# Altium schematic symbol library Regulator_Linear.SchLib: 1538 symbols (part 4 of 9)
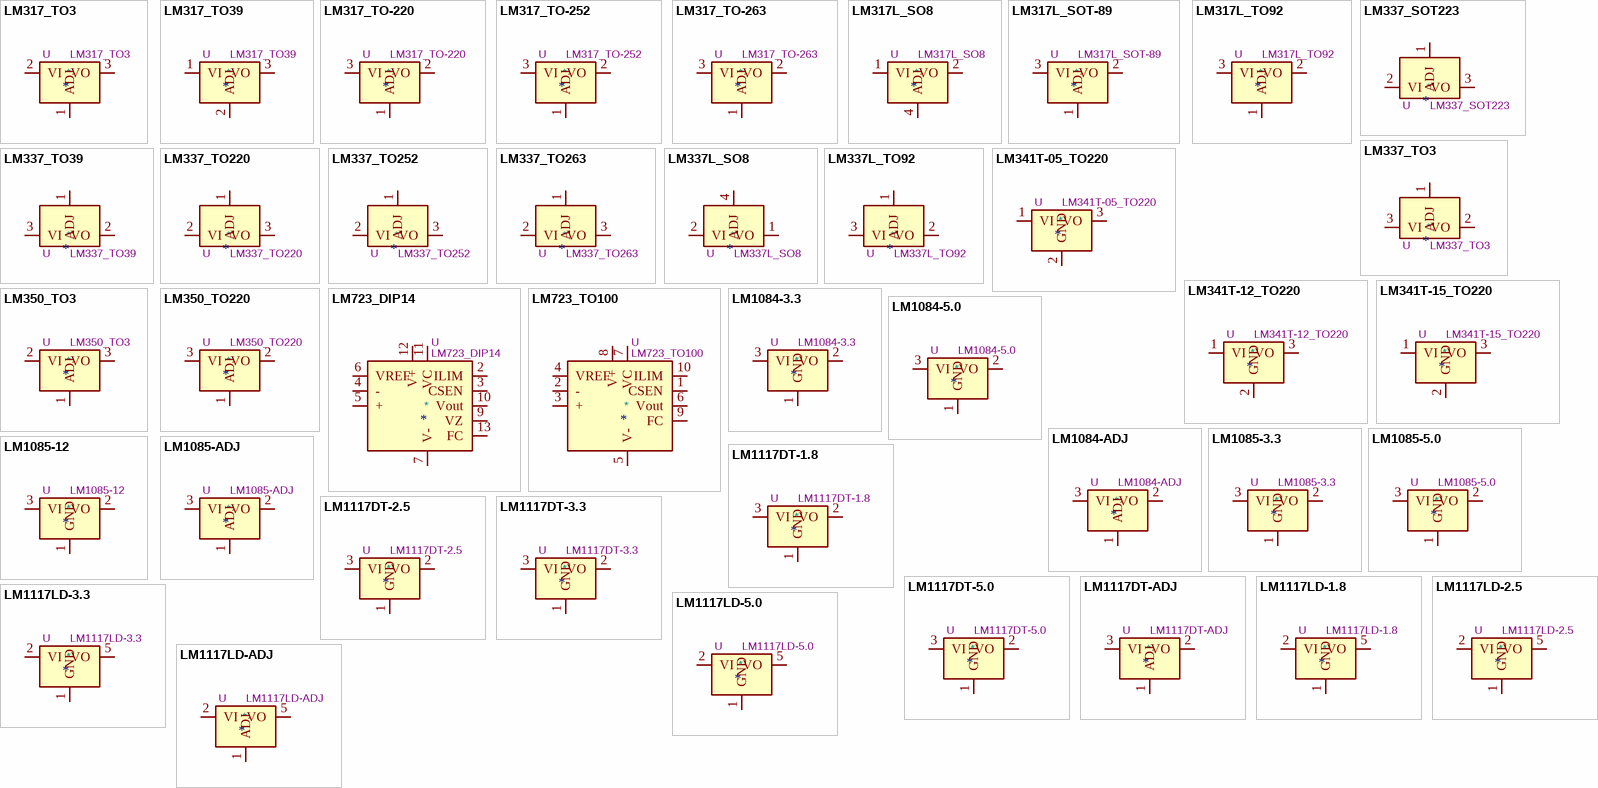
[diagram p41: symbols LM317_TO3 to LM1117LD-ADJ]

## LM350_TO3
designator *  value LM350_TO3  Reference: U
ki_keywords: Adjustable Voltage Regulator 3A Positive; ki_description: 3A 33V Adjustable Linear Regulator, TO-3; ki_fp_filters: TO?3*; Footprint: Package_TO_SOT_THT:TO-3; Datasheet: http://www.ti.com/lit/ds/symlink/lm350a.pdf
pins: 1 ADJ, 2 VI, 3 VO

## LM350_TO220
designator *  value LM350_TO220  Reference: U
ki_keywords: Adjustable Voltage Regulator 3A Positive; ki_description: 3A 33V Adjustable Linear Regulator, TO-220; ki_fp_filters: TO?220*; Footprint: Package_TO_SOT_THT:TO-220-3_Vertical; Datasheet: https://www.onsemi.com/pub/Collateral/LM350-D.pdf
pins: 1 ADJ, 2 VO, 3 VI

## LM723_DIP14
designator *  value LM723_DIP14  Reference: U
ki_keywords: POWER REGUL; ki_description: Linear Regulator (adjustable), DIP-14; ki_fp_filters: DIP*W7.62mm*; Footprint: Package_DIP:DIP-14_W7.62mm; Datasheet: http://www.ti.com/lit/ds/symlink/lm723.pdf
pins: 1 NC hidden, 2 ILIM, 3 CSEN, 4 -, 5 +, 6 VREF, 7 V-, 8 NC hidden, 9 VZ, 10 Vout, 11 VC, 12 V+, 13 FC, 14 NC hidden

## LM723_TO100
designator *  value LM723_TO100  Reference: U
ki_keywords: POWER REGUL; ki_description: Linear Regulator (adjustable), TO-100; ki_fp_filters: TO?100*; Footprint: Package_TO_SOT_THT:TO-100-10; Datasheet: http://www.ti.com/lit/ds/symlink/lm723.pdf
pins: 1 CSEN, 2 -, 3 +, 4 VREF, 5 V-, 6 Vout, 7 VC, 8 V+, 9 FC, 10 ILIM

## LM1084-3.3
designator *  value LM1084-3.3  Reference: U
ki_keywords: Voltage Regulator Fixed 5A Positive; ki_description: 5A 27V Linear Regulator, Fixed Output 3.3V, TO-220/TO-263; ki_fp_filters: TO?220* TO?263*; Datasheet: http://www.ti.com/lit/ds/symlink/lm1084.pdf
pins: 1 GND, 2 VO, 3 VI

## LM1084-5.0
designator *  value LM1084-5.0  Reference: U
ki_keywords: Voltage Regulator 5A Positive; ki_description: 5A 27V Linear Regulator, Fixed Output 5.0V, TO-220/TO-263; ki_fp_filters: TO?220* TO?263*; Datasheet: http://www.ti.com/lit/ds/symlink/lm1084.pdf
pins: 1 GND, 2 VO, 3 VI

## LM1084-ADJ
designator *  value LM1084-ADJ  Reference: U
ki_keywords: Adjustable Voltage Regulator 5A Positive; ki_description: 5A 29V Adjustable Linear Regulator, TO-220 / TO-263 (D2-PAK); ki_fp_filters: TO?220* TO?263*; Datasheet: http://www.ti.com/lit/ds/symlink/lm1084.pdf
pins: 1 ADJ, 2 VO, 3 VI

## LM1085-3.3
designator *  value LM1085-3.3  Reference: U
ki_keywords: Voltage Regulator Fixed 5A Positive; ki_description: 3A 27V Linear Regulator, Fixed Output 3.3V, TO-220/TO-263; ki_fp_filters: TO?220* TO?263*; Datasheet: http://www.ti.com/lit/ds/symlink/lm1085.pdf
pins: 1 GND, 2 VO, 3 VI

## LM1085-5.0
designator *  value LM1085-5.0  Reference: U
ki_keywords: Voltage Regulator 5A Positive; ki_description: 3A 25V Linear Regulator, Fixed Output 5.0V, TO-220/TO-263; ki_fp_filters: TO?220* TO?263*; Datasheet: http://www.ti.com/lit/ds/symlink/lm1085.pdf
pins: 1 GND, 2 VO, 3 VI

## LM1085-12
designator *  value LM1085-12  Reference: U
ki_keywords: Voltage Regulator 5A Positive; ki_description: 3A 18V Linear Regulator, Fixed Output 12.0V, TO-220/TO-263; ki_fp_filters: TO?220* TO?263*; Datasheet: http://www.ti.com/lit/ds/symlink/lm1085.pdf
pins: 1 GND, 2 VO, 3 VI

## LM1085-ADJ
designator *  value LM1085-ADJ  Reference: U
ki_keywords: Adjustable Voltage Regulator 5A Positive; ki_description: 3A 29V Adjustable Linear Regulator, TO-220 / TO-263 (D2-PAK); ki_fp_filters: TO?220* TO?263*; Datasheet: http://www.ti.com/lit/ds/symlink/lm1085.pdf
pins: 1 ADJ, 2 VO, 3 VI

## LM1117DT-1.8
designator *  value LM1117DT-1.8  Reference: U
ki_keywords: linear regulator ldo fixed positive; ki_description: 800mA Low-Dropout Linear Regulator, 1.8V fixed output, TO-252; ki_fp_filters: TO?252*; Footprint: Package_TO_SOT_SMD:TO-252-3_TabPin2; Datasheet: http://www.ti.com/lit/ds/symlink/lm1117.pdf
pins: 1 GND, 2 VO, 3 VI

## LM1117DT-2.5
designator *  value LM1117DT-2.5  Reference: U
ki_keywords: linear regulator ldo fixed positive; ki_description: 800mA Low-Dropout Linear Regulator, 2.5V fixed output, TO-252; ki_fp_filters: TO?252*; Footprint: Package_TO_SOT_SMD:TO-252-3_TabPin2; Datasheet: http://www.ti.com/lit/ds/symlink/lm1117.pdf
pins: 1 GND, 2 VO, 3 VI

## LM1117DT-3.3
designator *  value LM1117DT-3.3  Reference: U
ki_keywords: linear regulator ldo fixed positive; ki_description: 800mA Low-Dropout Linear Regulator, 3.3V fixed output, TO-252; ki_fp_filters: TO?252*; Footprint: Package_TO_SOT_SMD:TO-252-3_TabPin2; Datasheet: http://www.ti.com/lit/ds/symlink/lm1117.pdf
pins: 1 GND, 2 VO, 3 VI

## LM1117DT-5.0
designator *  value LM1117DT-5.0  Reference: U
ki_keywords: linear regulator ldo fixed positive; ki_description: 800mA Low-Dropout Linear Regulator, 5.0V fixed output, TO-252; ki_fp_filters: TO?252*; Footprint: Package_TO_SOT_SMD:TO-252-3_TabPin2; Datasheet: http://www.ti.com/lit/ds/symlink/lm1117.pdf
pins: 1 GND, 2 VO, 3 VI

## LM1117DT-ADJ
designator *  value LM1117DT-ADJ  Reference: U
ki_keywords: linear regulator ldo adjustable positive; ki_description: 800mA Low-Dropout Linear Regulator, adjustable output, TO-252; ki_fp_filters: TO?252*; Footprint: Package_TO_SOT_SMD:TO-252-3_TabPin2; Datasheet: http://www.ti.com/lit/ds/symlink/lm1117.pdf
pins: 1 ADJ, 2 VO, 3 VI

## LM1117LD-1.8
designator *  value LM1117LD-1.8  Reference: U
ki_keywords: linear regulator ldo fixed positive; ki_description: 800mA Low-Dropout Linear Regulator, 1.8V fixed output, WSON-8; ki_fp_filters: WSON?8*; Footprint: Package_SON:WSON-8-1EP_4x4mm_P0.8mm_EP2.2x3mm; Datasheet: http://www.ti.com/lit/ds/symlink/lm1117.pdf
pins: 1 GND, 2 VI, 3 VI hidden, 4 VI hidden, 5 VO, 6 VO hidden, 7 VO hidden, 8 NC hidden, 9 VO hidden

## LM1117LD-2.5
designator *  value LM1117LD-2.5  Reference: U
ki_keywords: linear regulator ldo fixed positive; ki_description: 800mA Low-Dropout Linear Regulator, 2.5V fixed output, WSON-8; ki_fp_filters: WSON?8*; Footprint: Package_SON:WSON-8-1EP_4x4mm_P0.8mm_EP2.2x3mm; Datasheet: http://www.ti.com/lit/ds/symlink/lm1117.pdf
pins: 1 GND, 2 VI, 3 VI hidden, 4 VI hidden, 5 VO, 6 VO hidden, 7 VO hidden, 8 NC hidden, 9 VO hidden

## LM1117LD-3.3
designator *  value LM1117LD-3.3  Reference: U
ki_keywords: linear regulator ldo fixed positive; ki_description: 800mA Low-Dropout Linear Regulator, 3.3V fixed output, WSON-8; ki_fp_filters: WSON?8*; Footprint: Package_SON:WSON-8-1EP_4x4mm_P0.8mm_EP2.2x3mm; Datasheet: http://www.ti.com/lit/ds/symlink/lm1117.pdf
pins: 1 GND, 2 VI, 3 VI hidden, 4 VI hidden, 5 VO, 6 VO hidden, 7 VO hidden, 8 NC hidden, 9 VO hidden

## LM1117LD-5.0
designator *  value LM1117LD-5.0  Reference: U
ki_keywords: linear regulator ldo fixed positive; ki_description: 800mA Low-Dropout Linear Regulator, 5.0V fixed output, WSON-8; ki_fp_filters: WSON?8*; Footprint: Package_SON:WSON-8-1EP_4x4mm_P0.8mm_EP2.2x3mm; Datasheet: http://www.ti.com/lit/ds/symlink/lm1117.pdf
pins: 1 GND, 2 VI, 3 VI hidden, 4 VI hidden, 5 VO, 6 VO hidden, 7 VO hidden, 8 NC hidden, 9 VO hidden

## LM1117LD-ADJ
designator *  value LM1117LD-ADJ  Reference: U
ki_keywords: linear regulator ldo adjustable positive; ki_description: 800mA Low-Dropout Linear Regulator, adjustable output, WSON-8; ki_fp_filters: WSON?8*; Footprint: Package_SON:WSON-8-1EP_4x4mm_P0.8mm_EP2.2x3mm; Datasheet: http://www.ti.com/lit/ds/symlink/lm1117.pdf
pins: 1 ADJ, 2 VI, 3 VI hidden, 4 VI hidden, 5 VO, 6 VO hidden, 7 VO hidden, 8 NC hidden, 9 VO hidden

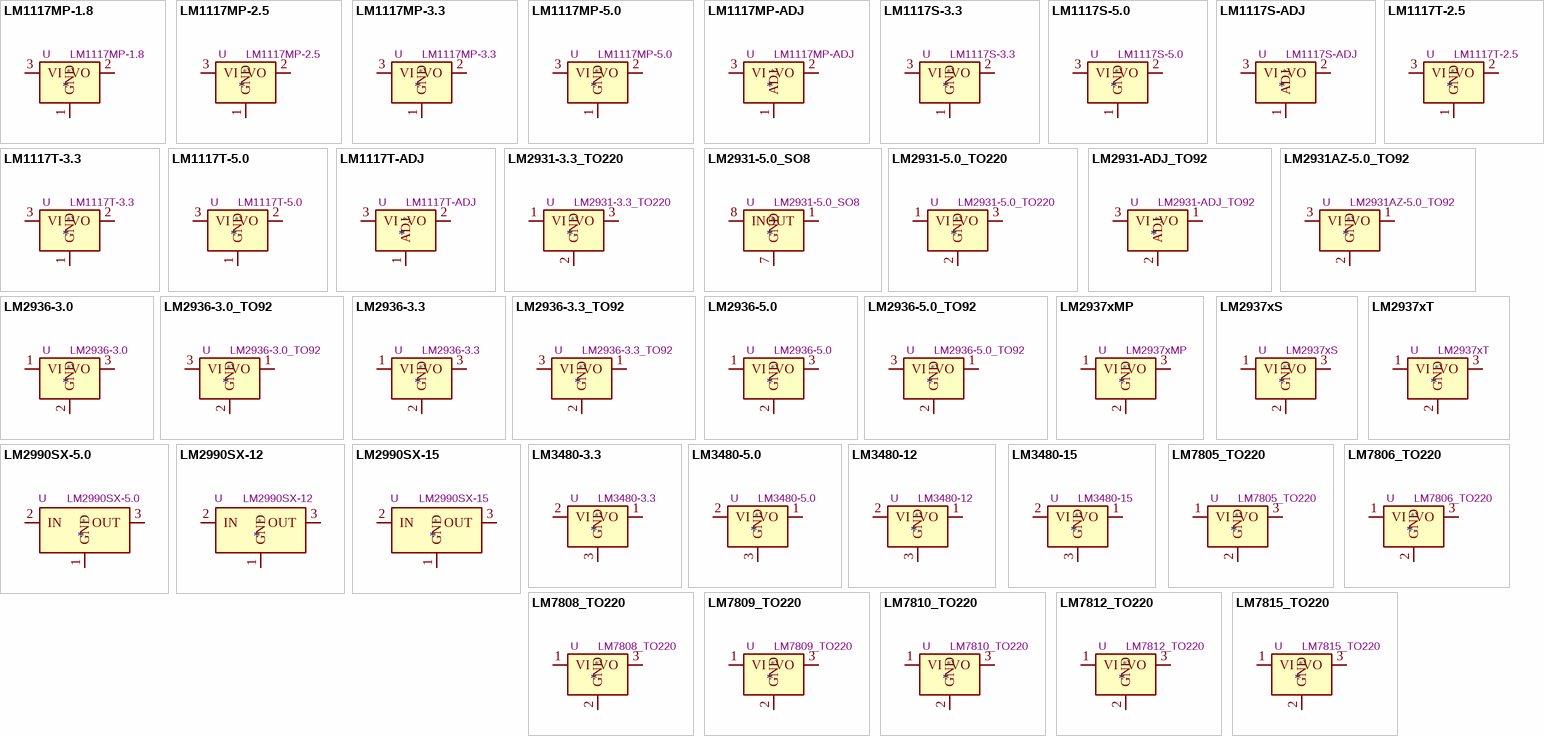
[diagram p14: symbols LM1117MP-1.8 to LM7815_TO220]

## LM1117MP-1.8
designator *  value LM1117MP-1.8  Reference: U
ki_keywords: linear regulator ldo fixed positive; ki_description: 800mA Low-Dropout Linear Regulator, 1.8V fixed output, SOT-223; ki_fp_filters: SOT?223*; Footprint: Package_TO_SOT_SMD:SOT-223-3_TabPin2; Datasheet: http://www.ti.com/lit/ds/symlink/lm1117.pdf
pins: 1 GND, 2 VO, 3 VI

## LM1117MP-2.5
designator *  value LM1117MP-2.5  Reference: U
ki_keywords: linear regulator ldo fixed positive; ki_description: 800mA Low-Dropout Linear Regulator, 2.5V fixed output, SOT-223; ki_fp_filters: SOT?223*; Footprint: Package_TO_SOT_SMD:SOT-223-3_TabPin2; Datasheet: http://www.ti.com/lit/ds/symlink/lm1117.pdf
pins: 1 GND, 2 VO, 3 VI

## LM1117MP-3.3
designator *  value LM1117MP-3.3  Reference: U
ki_keywords: linear regulator ldo fixed positive; ki_description: 800mA Low-Dropout Linear Regulator, 3.3V fixed output, SOT-223; ki_fp_filters: SOT?223*; Footprint: Package_TO_SOT_SMD:SOT-223-3_TabPin2; Datasheet: http://www.ti.com/lit/ds/symlink/lm1117.pdf
pins: 1 GND, 2 VO, 3 VI

## LM1117MP-5.0
designator *  value LM1117MP-5.0  Reference: U
ki_keywords: linear regulator ldo fixed positive; ki_description: 800mA Low-Dropout Linear Regulator, 5.0V fixed output, SOT-223; ki_fp_filters: SOT?223*; Footprint: Package_TO_SOT_SMD:SOT-223-3_TabPin2; Datasheet: http://www.ti.com/lit/ds/symlink/lm1117.pdf
pins: 1 GND, 2 VO, 3 VI

## LM1117MP-ADJ
designator *  value LM1117MP-ADJ  Reference: U
ki_keywords: linear regulator ldo adjustable positive; ki_description: 800mA Low-Dropout Linear Regulator, adjustable output, SOT-223; ki_fp_filters: SOT?223*; Footprint: Package_TO_SOT_SMD:SOT-223-3_TabPin2; Datasheet: http://www.ti.com/lit/ds/symlink/lm1117.pdf
pins: 1 ADJ, 2 VO, 3 VI

## LM1117S-3.3
designator *  value LM1117S-3.3  Reference: U
ki_keywords: linear regulator ldo fixed positive; ki_description: 800mA Low-Dropout Linear Regulator, 3.3V fixed output, TO-263; ki_fp_filters: TO?263*; Footprint: Package_TO_SOT_SMD:TO-263-3_TabPin2; Datasheet: http://www.ti.com/lit/ds/symlink/lm1117.pdf
pins: 1 GND, 2 VO, 3 VI

## LM1117S-5.0
designator *  value LM1117S-5.0  Reference: U
ki_keywords: linear regulator ldo fixed positive; ki_description: 800mA Low-Dropout Linear Regulator, 5.0V fixed output, TO-263; ki_fp_filters: TO?263*; Footprint: Package_TO_SOT_SMD:TO-263-3_TabPin2; Datasheet: http://www.ti.com/lit/ds/symlink/lm1117.pdf
pins: 1 GND, 2 VO, 3 VI

## LM1117S-ADJ
designator *  value LM1117S-ADJ  Reference: U
ki_keywords: linear regulator ldo adjustable positive; ki_description: 800mA Low-Dropout Linear Regulator, adjustable output, TO-263; ki_fp_filters: TO?263*; Footprint: Package_TO_SOT_SMD:TO-263-3_TabPin2; Datasheet: http://www.ti.com/lit/ds/symlink/lm1117.pdf
pins: 1 ADJ, 2 VO, 3 VI

## LM1117T-2.5
designator *  value LM1117T-2.5  Reference: U
ki_keywords: linear regulator ldo fixed positive; ki_description: 800mA Low-Dropout Linear Regulator, 2.5V fixed output, TO-220; ki_fp_filters: TO?220*; Footprint: Package_TO_SOT_THT:TO-220-3_Horizontal_TabDown; Datasheet: http://www.ti.com/lit/ds/symlink/lm1117.pdf
pins: 1 GND, 2 VO, 3 VI

## LM1117T-3.3
designator *  value LM1117T-3.3  Reference: U
ki_keywords: linear regulator ldo fixed positive; ki_description: 800mA Low-Dropout Linear Regulator, 3.3V fixed output, TO-220; ki_fp_filters: TO?220*; Footprint: Package_TO_SOT_THT:TO-220-3_Horizontal_TabDown; Datasheet: http://www.ti.com/lit/ds/symlink/lm1117.pdf
pins: 1 GND, 2 VO, 3 VI

## LM1117T-5.0
designator *  value LM1117T-5.0  Reference: U
ki_keywords: linear regulator ldo fixed positive; ki_description: 800mA Low-Dropout Linear Regulator, 5.0V fixed output, TO-220; ki_fp_filters: TO?220*; Footprint: Package_TO_SOT_THT:TO-220-3_Horizontal_TabDown; Datasheet: http://www.ti.com/lit/ds/symlink/lm1117.pdf
pins: 1 GND, 2 VO, 3 VI

## LM1117T-ADJ
designator *  value LM1117T-ADJ  Reference: U
ki_keywords: linear regulator ldo adjustable positive; ki_description: 800mA Low-Dropout Linear Regulator, adjustable output, TO-220; ki_fp_filters: TO?220*; Footprint: Package_TO_SOT_THT:TO-220-3_Horizontal_TabDown; Datasheet: http://www.ti.com/lit/ds/symlink/lm1117.pdf
pins: 1 ADJ, 2 VO, 3 VI

## LM2931-3.3_TO220
designator *  value LM2931-3.3_TO220  Reference: U
ki_keywords: Low Dropout Voltage Regulator 100mA Positive; ki_description: Positive 100 mA 60V Linear Low Dropout Regulator, Fixed Output 3.3V, TO-220; ki_fp_filters: TO?220*; Footprint: Package_TO_SOT_THT:TO-220-3_Vertical; Datasheet: https://www.ti.com/lit/ds/symlink/lm2931-n.pdf
pins: 1 VI, 2 GND, 3 VO

## LM2931-5.0_SO8
designator *  value LM2931-5.0_SO8  Reference: U
ki_keywords: Voltage Regulator 100mA Positive; ki_description: Positive 100mA 30V Linear Regulator, Fixed Output 5V, SO-8; ki_fp_filters: SOIC*3.9x4.9mm*P1.27mm*; Footprint: Package_SO:SOIC-8_3.9x4.9mm_P1.27mm; Datasheet: http://www.ti.com/lit/ds/symlink/lm2931-n.pdf
pins: 1 OUT, 2 GND hidden, 3 GND hidden, 4 NC hidden, 5 NC hidden, 6 GND hidden, 7 GND, 8 IN

## LM2931-5.0_TO220
designator *  value LM2931-5.0_TO220  Reference: U
ki_keywords: Low Dropout Voltage Regulator 100mA Positive; ki_description: Positive 100 mA 60V Linear Low Dropout Regulator, Fixed Output 5V, TO-220; ki_fp_filters: TO?220*; Footprint: Package_TO_SOT_THT:TO-220-3_Vertical; Datasheet: https://www.ti.com/lit/ds/symlink/lm2931-n.pdf
pins: 1 VI, 2 GND, 3 VO

## LM2931-ADJ_TO92
designator *  value LM2931-ADJ_TO92  Reference: U
ki_keywords: REGULATOR LDO Adjustable; ki_description: 100mA Low drop-out regulator, Adjustable Output, TO-92; ki_fp_filters: TO?92*; Footprint: Package_TO_SOT_THT:TO-92_Inline; Datasheet: http://www.ti.com/lit/ds/symlink/lm2931-n.pdf
pins: 1 VO, 2 ADJ, 3 VI

## LM2931AZ-5.0_TO92
designator *  value LM2931AZ-5.0_TO92  Reference: U
ki_keywords: REGULATOR LDO 5V; ki_description: 100mA Low drop-out regulator, Fixed Output 5V, TO-92; ki_fp_filters: TO?92*; Footprint: Package_TO_SOT_THT:TO-92_Inline; Datasheet: http://www.ti.com/lit/ds/symlink/lm2931-n.pdf
pins: 1 VO, 2 GND, 3 VI

## LM2936-3.0
designator *  value LM2936-3.0  Reference: U
ki_keywords: linear regulator ldo fixed positive; ki_description: 50mA Ultra-Low Quiescent Current LDO Voltage Regulator, 3.0V fixed output, TO-252/SOT-223; ki_fp_filters: TO?252* SOT?223*; Datasheet: http://www.ti.com/lit/ds/symlink/lm2936.pdf
pins: 1 VI, 2 GND, 3 VO

## LM2936-3.0_TO92
designator *  value LM2936-3.0_TO92  Reference: U
ki_keywords: linear regulator ldo fixed positive; ki_description: 50mA Ultra-Low Quiescent Current LDO Voltage Regulator, 3.0V fixed output, TO-92; ki_fp_filters: TO?92*; Footprint: Package_TO_SOT_THT:TO-92_Inline; Datasheet: http://www.ti.com/lit/ds/symlink/lm2936.pdf
pins: 1 VO, 2 GND, 3 VI

## LM2936-3.3
designator *  value LM2936-3.3  Reference: U
ki_keywords: linear regulator ldo fixed positive; ki_description: 50mA Ultra-Low Quiescent Current LDO Voltage Regulator, 3.3V fixed output, TO-252/SOT-223; ki_fp_filters: TO?252* SOT?223*; Datasheet: http://www.ti.com/lit/ds/symlink/lm2936.pdf
pins: 1 VI, 2 GND, 3 VO

## LM2936-3.3_TO92
designator *  value LM2936-3.3_TO92  Reference: U
ki_keywords: linear regulator ldo fixed positive; ki_description: 50mA Ultra-Low Quiescent Current LDO Voltage Regulator, 3.3V fixed output, TO-92; ki_fp_filters: TO?92*; Footprint: Package_TO_SOT_THT:TO-92_Inline; Datasheet: http://www.ti.com/lit/ds/symlink/lm2936.pdf
pins: 1 VO, 2 GND, 3 VI

## LM2936-5.0
designator *  value LM2936-5.0  Reference: U
ki_keywords: linear regulator ldo fixed positive; ki_description: 50mA Ultra-Low Quiescent Current LDO Voltage Regulator, 5.0V fixed output, TO-252/SOT-223; ki_fp_filters: TO?252* SOT?223*; Datasheet: http://www.ti.com/lit/ds/symlink/lm2936.pdf
pins: 1 VI, 2 GND, 3 VO

## LM2936-5.0_TO92
designator *  value LM2936-5.0_TO92  Reference: U
ki_keywords: linear regulator ldo fixed positive; ki_description: 50mA Ultra-Low Quiescent Current LDO Voltage Regulator, 5.0V fixed output, TO-92; ki_fp_filters: TO?92*; Footprint: Package_TO_SOT_THT:TO-92_Inline; Datasheet: http://www.ti.com/lit/ds/symlink/lm2936.pdf
pins: 1 VO, 2 GND, 3 VI

## LM2937xMP
designator *  value LM2937xMP  Reference: U
ki_keywords: Voltage Regulator Low Dropuout Positive LDO; ki_description: 500-mA Low Dropout Regulator, SOT-223; ki_fp_filters: SOT?223*; Footprint: Package_TO_SOT_SMD:SOT-223-3_TabPin2; Datasheet: http://www.ti.com/lit/ds/symlink/lm2937.pdf
pins: 1 VI, 2 GND, 3 VO

## LM2937xS
designator *  value LM2937xS  Reference: U
ki_keywords: Voltage Regulator Low Dropuout Positive LDO; ki_description: 500-mA Low Dropout Regulator, TO-263; ki_fp_filters: TO?263*; Footprint: Package_TO_SOT_SMD:TO-263-3_TabPin2; Datasheet: http://www.ti.com/lit/ds/symlink/lm2937.pdf
pins: 1 VI, 2 GND, 3 VO

## LM2937xT
designator *  value LM2937xT  Reference: U
ki_keywords: Voltage Regulator Low Dropuout Positive LDO; ki_description: 500-mA Low Dropout Regulator, TO-220; ki_fp_filters: TO?220*; Footprint: Package_TO_SOT_THT:TO-220-3_Vertical; Datasheet: http://www.ti.com/lit/ds/symlink/lm2937.pdf
pins: 1 VI, 2 GND, 3 VO

## LM2990SX-5.0
designator *  value LM2990SX-5.0  Reference: U
ki_keywords: Negative voltage regulator; ki_description: Three termianl low-dropout 1A negative voltage regulator, Input -6V to -26V, Out -5V; ki_fp_filters: TO?263*TabPin2* TO?220*; Datasheet: http://www.ti.com/lit/ds/symlink/lm2990.pdf
pins: 1 GND, 2 IN, 3 OUT

## LM2990SX-12
designator *  value LM2990SX-12  Reference: U
ki_keywords: Negative voltage regulator; ki_description: Three termianl low-dropout 1A negative voltage regulator, Input -6V to -26V, Out -12V; ki_fp_filters: TO?263*TabPin2* TO?220*; Datasheet: http://www.ti.com/lit/ds/symlink/lm2990.pdf
pins: 1 GND, 2 IN, 3 OUT

## LM2990SX-15
designator *  value LM2990SX-15  Reference: U
ki_keywords: Negative voltage regulator; ki_description: Three termianl low-dropout 1A negative voltage regulator, Input -6V to -26V, Out -15V; ki_fp_filters: TO?263*TabPin2* TO?220*; Datasheet: http://www.ti.com/lit/ds/symlink/lm2990.pdf
pins: 1 GND, 2 IN, 3 OUT

## LM3480-3.3
designator *  value LM3480-3.3  Reference: U
ki_keywords: ldo linear fixed positive; ki_description: 100mA, Quasi Low Dropout Voltage Regulator, 3.3V positive fixed output, SOT-23 package; ki_fp_filters: SOT?23*; Footprint: Package_TO_SOT_SMD:SOT-23; Datasheet: http://www.ti.com/lit/ds/symlink/lm3480.pdf
pins: 1 VO, 2 VI, 3 GND

## LM3480-5.0
designator *  value LM3480-5.0  Reference: U
ki_keywords: ldo linear fixed positive; ki_description: 100mA, Quasi Low Dropout Voltage Regulator, 5.0V positive fixed output, SOT-23 package; ki_fp_filters: SOT?23*; Footprint: Package_TO_SOT_SMD:SOT-23; Datasheet: http://www.ti.com/lit/ds/symlink/lm3480.pdf
pins: 1 VO, 2 VI, 3 GND

## LM3480-12
designator *  value LM3480-12  Reference: U
ki_keywords: ldo linear fixed positive; ki_description: 100mA, Quasi Low Dropout Voltage Regulator, 12V positive fixed output, SOT-23 package; ki_fp_filters: SOT?23*; Footprint: Package_TO_SOT_SMD:SOT-23; Datasheet: http://www.ti.com/lit/ds/symlink/lm3480.pdf
pins: 1 VO, 2 VI, 3 GND

## LM3480-15
designator *  value LM3480-15  Reference: U
ki_keywords: ldo linear fixed positive; ki_description: 100mA, Quasi Low Dropout Voltage Regulator, 15V positive fixed output, SOT-23 package; ki_fp_filters: SOT?23*; Footprint: Package_TO_SOT_SMD:SOT-23; Datasheet: http://www.ti.com/lit/ds/symlink/lm3480.pdf
pins: 1 VO, 2 VI, 3 GND

## LM7805_TO220
designator *  value LM7805_TO220  Reference: U
ki_keywords: Voltage Regulator 1A Positive; ki_description: Positive 1A 35V Linear Regulator, Fixed Output 5V, TO-220; ki_fp_filters: TO?220*; Footprint: Package_TO_SOT_THT:TO-220-3_Vertical; Datasheet: https://www.onsemi.cn/PowerSolutions/document/MC7800-D.PDF
pins: 1 VI, 2 GND, 3 VO

## LM7806_TO220
designator *  value LM7806_TO220  Reference: U
ki_keywords: Voltage Regulator 1A Positive; ki_description: Positive 1A 35V Linear Regulator, Fixed Output 6V, TO-220; ki_fp_filters: TO?220*; Footprint: Package_TO_SOT_THT:TO-220-3_Vertical; Datasheet: https://www.onsemi.cn/PowerSolutions/document/MC7800-D.PDF
pins: 1 VI, 2 GND, 3 VO

## LM7808_TO220
designator *  value LM7808_TO220  Reference: U
ki_keywords: Voltage Regulator 1A Positive; ki_description: Positive 1A 35V Linear Regulator, Fixed Output 8V, TO-220; ki_fp_filters: TO?220*; Footprint: Package_TO_SOT_THT:TO-220-3_Vertical; Datasheet: https://www.onsemi.cn/PowerSolutions/document/MC7800-D.PDF
pins: 1 VI, 2 GND, 3 VO

## LM7809_TO220
designator *  value LM7809_TO220  Reference: U
ki_keywords: Voltage Regulator 1A Positive; ki_description: Positive 1A 35V Linear Regulator, Fixed Output 9V, TO-220; ki_fp_filters: TO?220*; Footprint: Package_TO_SOT_THT:TO-220-3_Vertical; Datasheet: https://www.onsemi.cn/PowerSolutions/document/MC7800-D.PDF
pins: 1 VI, 2 GND, 3 VO

## LM7810_TO220
designator *  value LM7810_TO220  Reference: U
ki_keywords: Voltage Regulator 1A Positive; ki_description: Positive 1A 35V Linear Regulator, Fixed Output 10V, TO-220; ki_fp_filters: TO?220*; Footprint: Package_TO_SOT_THT:TO-220-3_Vertical; Datasheet: https://www.onsemi.cn/PowerSolutions/document/MC7800-D.PDF
pins: 1 VI, 2 GND, 3 VO

## LM7812_TO220
designator *  value LM7812_TO220  Reference: U
ki_keywords: Voltage Regulator 1A Positive; ki_description: Positive 1A 35V Linear Regulator, Fixed Output 12V, TO-220; ki_fp_filters: TO?220*; Footprint: Package_TO_SOT_THT:TO-220-3_Vertical; Datasheet: https://www.onsemi.cn/PowerSolutions/document/MC7800-D.PDF
pins: 1 VI, 2 GND, 3 VO

## LM7815_TO220
designator *  value LM7815_TO220  Reference: U
ki_keywords: Voltage Regulator 1A Positive; ki_description: Positive 1A 35V Linear Regulator, Fixed Output 15V, TO-220; ki_fp_filters: TO?220*; Footprint: Package_TO_SOT_THT:TO-220-3_Vertical; Datasheet: https://www.onsemi.cn/PowerSolutions/document/MC7800-D.PDF
pins: 1 VI, 2 GND, 3 VO

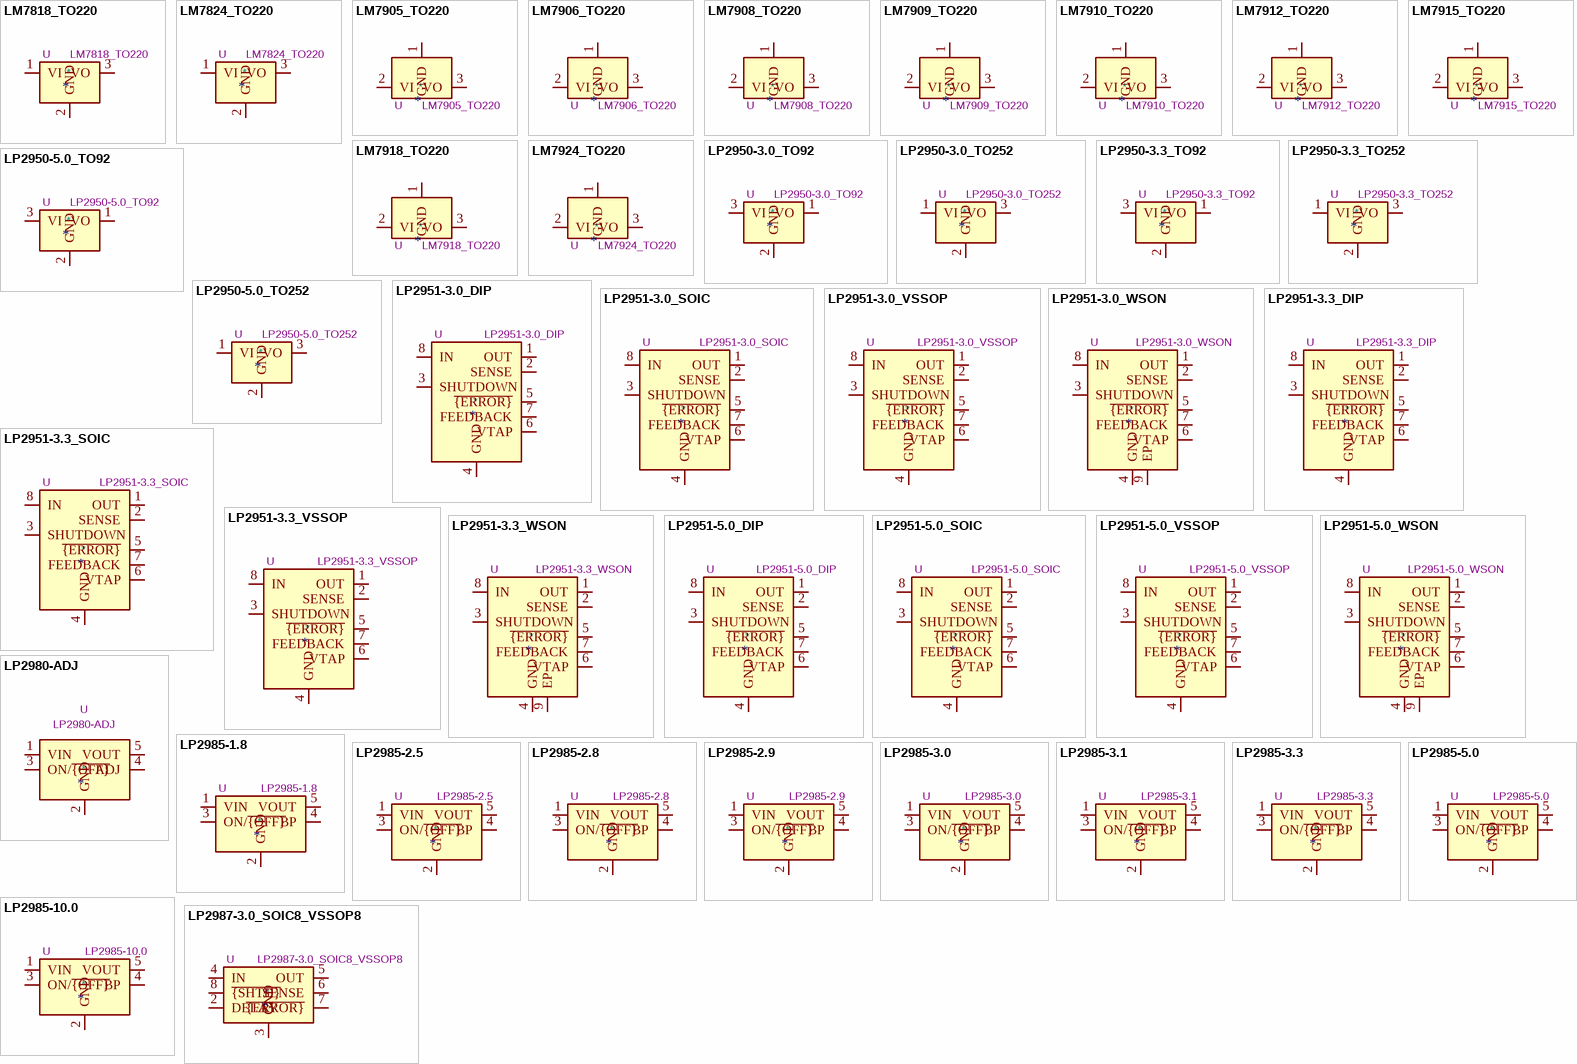
[diagram p15: symbols LM7818_TO220 to LP2987-3.0_SOIC8_VSSOP8]

## LM7818_TO220
designator *  value LM7818_TO220  Reference: U
ki_keywords: Voltage Regulator 1A Positive; ki_description: Positive 1A 35V Linear Regulator, Fixed Output 18V, TO-220; ki_fp_filters: TO?220*; Footprint: Package_TO_SOT_THT:TO-220-3_Vertical; Datasheet: https://www.onsemi.cn/PowerSolutions/document/MC7800-D.PDF
pins: 1 VI, 2 GND, 3 VO

## LM7824_TO220
designator *  value LM7824_TO220  Reference: U
ki_keywords: Voltage Regulator 1A Positive; ki_description: Positive 1A 35V Linear Regulator, Fixed Output 24V, TO-220; ki_fp_filters: TO?220*; Footprint: Package_TO_SOT_THT:TO-220-3_Vertical; Datasheet: https://www.onsemi.cn/PowerSolutions/document/MC7800-D.PDF
pins: 1 VI, 2 GND, 3 VO

## LM7905_TO220
designator *  value LM7905_TO220  Reference: U
ki_keywords: Voltage Regulator 1A Negative; ki_description: Negative 1A 35V Linear Regulator, Fixed Output 5V, TO-220; ki_fp_filters: TO?220*; Footprint: Package_TO_SOT_THT:TO-220-3_Vertical; Datasheet: https://www.onsemi.com/pub/Collateral/MC7900-D.PDF
pins: 1 GND, 2 VI, 3 VO

## LM7906_TO220
designator *  value LM7906_TO220  Reference: U
ki_keywords: Voltage Regulator 1A Negative; ki_description: Negative 1A 35V Linear Regulator, Fixed Output 6V, TO-220; ki_fp_filters: TO?220*; Footprint: Package_TO_SOT_THT:TO-220-3_Vertical; Datasheet: https://www.onsemi.com/pub/Collateral/MC7900-D.PDF
pins: 1 GND, 2 VI, 3 VO

## LM7908_TO220
designator *  value LM7908_TO220  Reference: U
ki_keywords: Voltage Regulator 1A Negative; ki_description: Negative 1A 35V Linear Regulator, Fixed Output 8V, TO-220; ki_fp_filters: TO?220*; Footprint: Package_TO_SOT_THT:TO-220-3_Vertical; Datasheet: https://www.onsemi.com/pub/Collateral/MC7900-D.PDF
pins: 1 GND, 2 VI, 3 VO

## LM7909_TO220
designator *  value LM7909_TO220  Reference: U
ki_keywords: Voltage Regulator 1A Negative; ki_description: Negative 1A 35V Linear Regulator, Fixed Output 9V, TO-220; ki_fp_filters: TO?220*; Footprint: Package_TO_SOT_THT:TO-220-3_Vertical; Datasheet: https://www.onsemi.com/pub/Collateral/MC7900-D.PDF
pins: 1 GND, 2 VI, 3 VO

## LM7910_TO220
designator *  value LM7910_TO220  Reference: U
ki_keywords: Voltage Regulator 1A Negative; ki_description: Negative 1A 35V Linear Regulator, Fixed Output 10V, TO-220; ki_fp_filters: TO?220*; Footprint: Package_TO_SOT_THT:TO-220-3_Vertical; Datasheet: https://www.onsemi.com/pub/Collateral/MC7900-D.PDF
pins: 1 GND, 2 VI, 3 VO

## LM7912_TO220
designator *  value LM7912_TO220  Reference: U
ki_keywords: Voltage Regulator 1A Negative; ki_description: Negative 1A 35V Linear Regulator, Fixed Output 12V, TO-220; ki_fp_filters: TO?220*; Footprint: Package_TO_SOT_THT:TO-220-3_Vertical; Datasheet: hhttps://www.onsemi.com/pub/Collateral/MC7900-D.PDF
pins: 1 GND, 2 VI, 3 VO

## LM7915_TO220
designator *  value LM7915_TO220  Reference: U
ki_keywords: Voltage Regulator 1A Negative; ki_description: Negative 1A 35V Linear Regulator, Fixed Output 15V, TO-220; ki_fp_filters: TO?220*; Footprint: Package_TO_SOT_THT:TO-220-3_Vertical; Datasheet: https://www.onsemi.com/pub/Collateral/MC7900-D.PDF
pins: 1 GND, 2 VI, 3 VO

## LM7918_TO220
designator *  value LM7918_TO220  Reference: U
ki_keywords: Voltage Regulator 1A Negative; ki_description: Negative 1A 35V Linear Regulator, Fixed Output 18V, TO-220; ki_fp_filters: TO?220*; Footprint: Package_TO_SOT_THT:TO-220-3_Vertical; Datasheet: https://www.onsemi.com/pub/Collateral/MC7900-D.PDF
pins: 1 GND, 2 VI, 3 VO

## LM7924_TO220
designator *  value LM7924_TO220  Reference: U
ki_keywords: Voltage Regulator 1A Negative; ki_description: Negative 1A 35V Linear Regulator, Fixed Output 24V, TO-220; ki_fp_filters: TO?220*; Footprint: Package_TO_SOT_THT:TO-220-3_Vertical; Datasheet: https://www.onsemi.com/pub/Collateral/MC7900-D.PDF
pins: 1 GND, 2 VI, 3 VO

## LP2950-3.0_TO92
designator *  value LP2950-3.0_TO92  Reference: U
ki_keywords: Micropower Voltage Regulator 100mA Positive; ki_description: Positive 100mA 30V Linear Micropower Voltage Regulator, Fixed Output 3.0V, TO-92; ki_fp_filters: TO?92*; Footprint: Package_TO_SOT_THT:TO-92_Inline; Datasheet: http://www.ti.com/lit/ds/symlink/lp2950.pdf
pins: 1 VO, 2 GND, 3 VI

## LP2950-3.0_TO252
designator *  value LP2950-3.0_TO252  Reference: U
ki_keywords: Micropower Voltage Regulator 100mA Positive; ki_description: Positive 100mA 30V Linear Micropower Voltage Regulator, Fixed Output 3.0V, TO-252; ki_fp_filters: TO?252*; Footprint: Package_TO_SOT_SMD:TO-252-2; Datasheet: http://www.ti.com/lit/ds/symlink/lp2950.pdf
pins: 1 VI, 2 GND, 3 VO

## LP2950-3.3_TO92
designator *  value LP2950-3.3_TO92  Reference: U
ki_keywords: Micropower Voltage Regulator 100mA Positive; ki_description: Positive 100mA 30V Linear Micropower Voltage Regulator, Fixed Output 3.3V, TO-92; ki_fp_filters: TO?92*; Footprint: Package_TO_SOT_THT:TO-92_Inline; Datasheet: http://www.ti.com/lit/ds/symlink/lp2950.pdf
pins: 1 VO, 2 GND, 3 VI

## LP2950-3.3_TO252
designator *  value LP2950-3.3_TO252  Reference: U
ki_keywords: Micropower Voltage Regulator 100mA Positive; ki_description: Positive 100mA 30V Linear Micropower Voltage Regulator, Fixed Output 3.3V, TO-252; ki_fp_filters: TO?252*; Footprint: Package_TO_SOT_SMD:TO-252-2; Datasheet: http://www.ti.com/lit/ds/symlink/lp2950.pdf
pins: 1 VI, 2 GND, 3 VO

## LP2950-5.0_TO92
designator *  value LP2950-5.0_TO92  Reference: U
ki_keywords: Micropower Voltage Regulator 100mA Positive; ki_description: Micropower Voltage Regulators with Shutdown, 100mA, Fixed Output 5.0V, TO-92; ki_fp_filters: TO?92*; Footprint: Package_TO_SOT_THT:TO-92_Inline; Datasheet: http://www.ti.com/lit/ds/symlink/lp2951.pdf
pins: 1 VO, 2 GND, 3 VI

## LP2950-5.0_TO252
designator *  value LP2950-5.0_TO252  Reference: U
ki_keywords: Micropower Voltage Regulator 100mA Positive; ki_description: Positive 100mA 30V Linear Micropower Voltage Regulator, Fixed Output 5.0V, TO-252; ki_fp_filters: TO?252*; Footprint: Package_TO_SOT_SMD:TO-252-2; Datasheet: http://www.ti.com/lit/ds/symlink/lp2950.pdf
pins: 1 VI, 2 GND, 3 VO

## LP2951-3.0_DIP
designator *  value LP2951-3.0_DIP  Reference: U
ki_keywords: Micropower Voltage Regulators with Shutdown; ki_description: Micropower Voltage Regulators with Shutdown, 100mA, Fixed Output 3.0V, LDO, DIP-8; ki_fp_filters: DIP*W7.62mm*; Footprint: Package_DIP:DIP-8_W7.62mm; Datasheet: http://www.ti.com/lit/ds/symlink/lp2951.pdf
pins: 1 OUT, 2 SENSE, 3 SHUTDOWN, 4 GND, 5 ~{{ERROR}}, 6 VTAP, 7 FEEDBACK, 8 IN

## LP2951-3.0_SOIC
designator *  value LP2951-3.0_SOIC  Reference: U
ki_keywords: Micropower Voltage Regulators with Shutdown; ki_description: Micropower Voltage Regulators with Shutdown, 100mA, Fixed Output 3.0V, LDO, SOIC-8; ki_fp_filters: SOIC*3.9x4.9mm*P1.27mm*; Footprint: Package_SO:SOIC-8_3.9x4.9mm_P1.27mm; Datasheet: http://www.ti.com/lit/ds/symlink/lp2951.pdf
pins: 1 OUT, 2 SENSE, 3 SHUTDOWN, 4 GND, 5 ~{{ERROR}}, 6 VTAP, 7 FEEDBACK, 8 IN

## LP2951-3.0_VSSOP
designator *  value LP2951-3.0_VSSOP  Reference: U
ki_keywords: Micropower Voltage Regulators with Shutdown; ki_description: Micropower Voltage Regulators with Shutdown, 100mA, Fixed Output 3.0V, LDO, VSSOP-8; ki_fp_filters: VSSOP*3.0x3.0mm*P0.65mm*; Footprint: Package_SO:VSSOP-8_3.0x3.0mm_P0.65mm; Datasheet: http://www.ti.com/lit/ds/symlink/lp2951.pdf
pins: 1 OUT, 2 SENSE, 3 SHUTDOWN, 4 GND, 5 ~{{ERROR}}, 6 VTAP, 7 FEEDBACK, 8 IN

## LP2951-3.0_WSON
designator *  value LP2951-3.0_WSON  Reference: U
ki_keywords: Micropower Voltage Regulators with Shutdown; ki_description: Micropower Voltage Regulators with Shutdown, 100mA, Fixed Output 3.0V, LDO, WSON-8; ki_fp_filters: WSON*1EP*3x3mm*P0.5mm*; Footprint: Package_SON:WSON-8-1EP_3x3mm_P0.5mm_EP1.2x2mm; Datasheet: http://www.ti.com/lit/ds/symlink/lp2951.pdf
pins: 1 OUT, 2 SENSE, 3 SHUTDOWN, 4 GND, 5 ~{{ERROR}}, 6 VTAP, 7 FEEDBACK, 8 IN, 9 EP

## LP2951-3.3_DIP
designator *  value LP2951-3.3_DIP  Reference: U
ki_keywords: Micropower Voltage Regulators with Shutdown; ki_description: Micropower Voltage Regulators with Shutdown, 100mA, Fixed Output 3.3V, LDO, DIP-8; ki_fp_filters: DIP*W7.62mm*; Footprint: Package_DIP:DIP-8_W7.62mm; Datasheet: http://www.ti.com/lit/ds/symlink/lp2951.pdf
pins: 1 OUT, 2 SENSE, 3 SHUTDOWN, 4 GND, 5 ~{{ERROR}}, 6 VTAP, 7 FEEDBACK, 8 IN

## LP2951-3.3_SOIC
designator *  value LP2951-3.3_SOIC  Reference: U
ki_keywords: Micropower Voltage Regulators with Shutdown; ki_description: Micropower Voltage Regulators with Shutdown, 100mA, Fixed Output 3.3V, LDO, SOIC-8; ki_fp_filters: SOIC*3.9x4.9mm*P1.27mm*; Footprint: Package_SO:SOIC-8_3.9x4.9mm_P1.27mm; Datasheet: http://www.ti.com/lit/ds/symlink/lp2951.pdf
pins: 1 OUT, 2 SENSE, 3 SHUTDOWN, 4 GND, 5 ~{{ERROR}}, 6 VTAP, 7 FEEDBACK, 8 IN

## LP2951-3.3_VSSOP
designator *  value LP2951-3.3_VSSOP  Reference: U
ki_keywords: Micropower Voltage Regulators with Shutdown; ki_description: Micropower Voltage Regulators with Shutdown, 100mA, Fixed Output 3.3V, LDO, VSSOP-8; ki_fp_filters: VSSOP*3.0x3.0mm*P0.65mm*; Footprint: Package_SO:VSSOP-8_3.0x3.0mm_P0.65mm; Datasheet: http://www.ti.com/lit/ds/symlink/lp2951.pdf
pins: 1 OUT, 2 SENSE, 3 SHUTDOWN, 4 GND, 5 ~{{ERROR}}, 6 VTAP, 7 FEEDBACK, 8 IN

## LP2951-3.3_WSON
designator *  value LP2951-3.3_WSON  Reference: U
ki_keywords: Micropower Voltage Regulators with Shutdown; ki_description: Micropower Voltage Regulators with Shutdown, 100mA, Fixed Output 3.3V, LDO, WSON-8; ki_fp_filters: WSON*1EP*3x3mm*P0.5mm*; Footprint: Package_SON:WSON-8-1EP_3x3mm_P0.5mm_EP1.2x2mm; Datasheet: http://www.ti.com/lit/ds/symlink/lp2951.pdf
pins: 1 OUT, 2 SENSE, 3 SHUTDOWN, 4 GND, 5 ~{{ERROR}}, 6 VTAP, 7 FEEDBACK, 8 IN, 9 EP

## LP2951-5.0_DIP
designator *  value LP2951-5.0_DIP  Reference: U
ki_keywords: Micropower Voltage Regulators with Shutdown; ki_description: Micropower Voltage Regulators with Shutdown, 100mA, Fixed Output 5.0V, LDO, DIP-8; ki_fp_filters: DIP*W7.62mm*; Footprint: Package_DIP:DIP-8_W7.62mm; Datasheet: http://www.ti.com/lit/ds/symlink/lp2951.pdf
pins: 1 OUT, 2 SENSE, 3 SHUTDOWN, 4 GND, 5 ~{{ERROR}}, 6 VTAP, 7 FEEDBACK, 8 IN

## LP2951-5.0_SOIC
designator *  value LP2951-5.0_SOIC  Reference: U
ki_keywords: Micropower Voltage Regulators with Shutdown; ki_description: Micropower Voltage Regulators with Shutdown, 100mA, Fixed Output 5.0V, LDO, SOIC-8; ki_fp_filters: SOIC*3.9x4.9mm*P1.27mm*; Footprint: Package_SO:SOIC-8_3.9x4.9mm_P1.27mm; Datasheet: http://www.ti.com/lit/ds/symlink/lp2951.pdf
pins: 1 OUT, 2 SENSE, 3 SHUTDOWN, 4 GND, 5 ~{{ERROR}}, 6 VTAP, 7 FEEDBACK, 8 IN

## LP2951-5.0_VSSOP
designator *  value LP2951-5.0_VSSOP  Reference: U
ki_keywords: Micropower Voltage Regulators with Shutdown; ki_description: Micropower Voltage Regulators with Shutdown, 100mA, Fixed Output 5.0V, LDO, VSSOP-8; ki_fp_filters: VSSOP*3.0x3.0mm*P0.65mm*; Footprint: Package_SO:VSSOP-8_3.0x3.0mm_P0.65mm; Datasheet: http://www.ti.com/lit/ds/symlink/lp2951.pdf
pins: 1 OUT, 2 SENSE, 3 SHUTDOWN, 4 GND, 5 ~{{ERROR}}, 6 VTAP, 7 FEEDBACK, 8 IN
